# Altium integrated library WCAP-ATLI_rev15a.intlib: 161 symbols (part 1 of 2) (continued)
## WCAP-ATLI 16x31.5x7.5x0.8 860080480026 (continued)
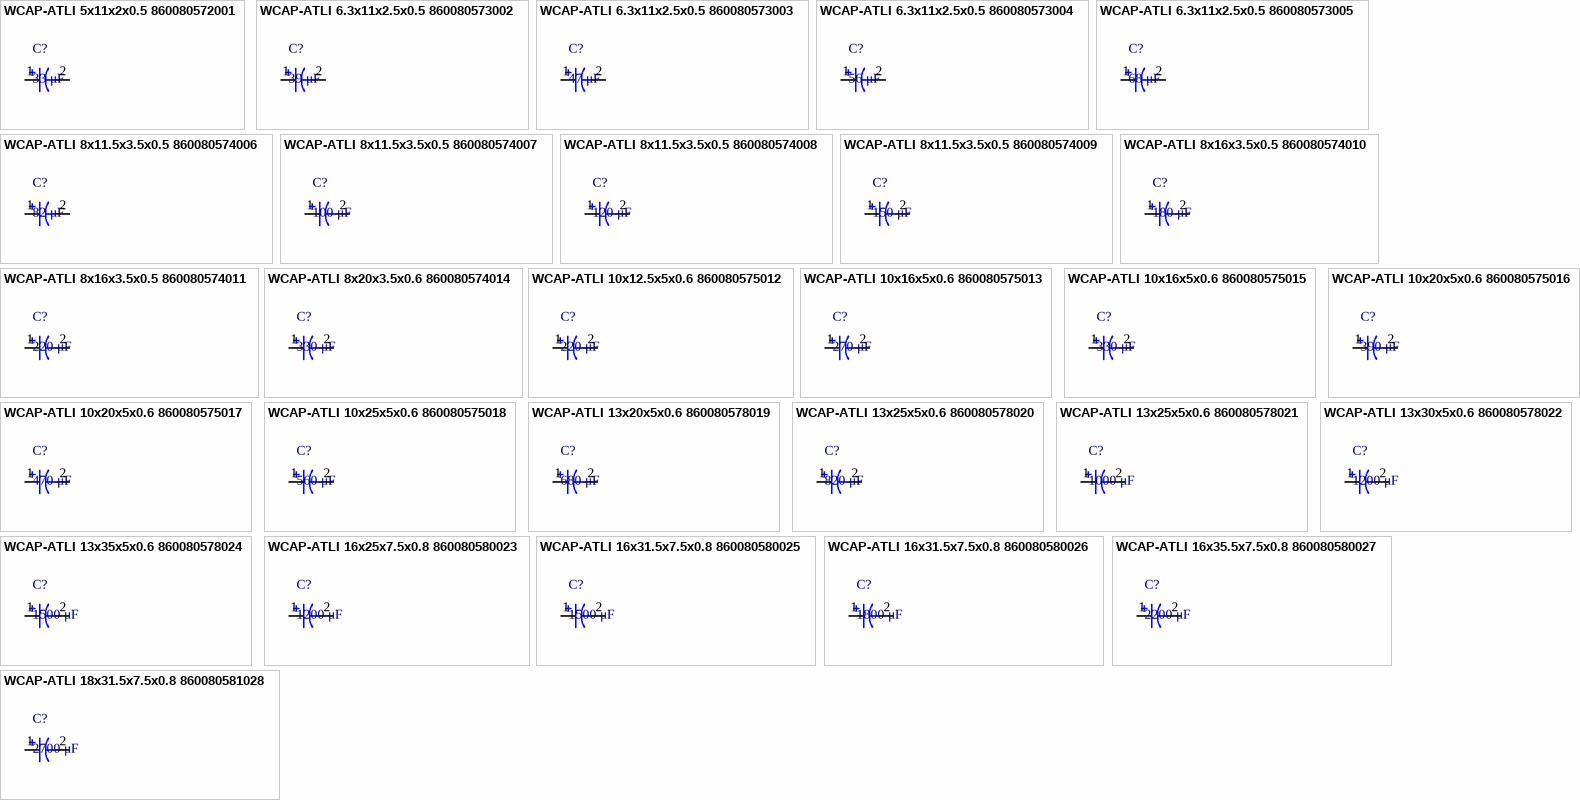
[diagram p2: symbols WCAP-ATLI 5x11x2x0.5 860080572001 to WCAP-ATLI 18x31.5x7.5x0.8 860080581028]

## WCAP-ATLI 5x11x2x0.5 860080572001
designator C?, comment 33 μF
WCAP-ATLI Aluminum Electrolytic Capacitors , 33 μF; + / - 20%; 35 V , 5 x 11; Manufacturer: Wurth Elektronik; partNo: 860080572001; E-mail: libraries@we-online.com; Characteristics: Aluminum Electrolytic Capacitor;Recommended soldering: Wave;Operating temperature: –55 °C to +105 °C;Low impedance product series;Load life: 2000–5000 h @ +105 °C; ComponentLink1Description: Manufacturer; ComponentLink1URL: http://www.we-online.com; ComponentLink2Description: Datasheet; ComponentLink2URL: http://katalog.we-online.de/pbs/datasheet/860080572001.pdf; Created by: Karrer Zheng; Created Date: 5/13/2015; Capacitance: 33 μF; Application: Applied to high frequency secondary side output filter loop, general switching power supply, DC-DC converter, AC-DC converter, adapter, charger, TV, VCR, DC motor circuit filter, LCD TV digital audio, digital TV, digital camera, digital video camera, satellite receiver and etc.
footprint WCAP-ATLI 5x11x2x0.5
pins: 1, 2

## WCAP-ATLI 6.3x11x2.5x0.5 860080573002
designator C?, comment 39 μF
WCAP-ATLI Aluminum Electrolytic Capacitors , 39 μF; + / - 20%; 35 V , 6,3 x 11; Manufacturer: Wurth Elektronik; partNo: 860080573002; E-mail: libraries@we-online.com; Characteristics: Aluminum Electrolytic Capacitor;Recommended soldering: Wave;Operating temperature: –55 °C to +105 °C;Low impedance product series;Load life: 2000–5000 h @ +105 °C; ComponentLink1Description: Manufacturer; ComponentLink1URL: http://www.we-online.com; ComponentLink2Description: Datasheet; ComponentLink2URL: http://katalog.we-online.de/pbs/datasheet/860080573002.pdf; Created by: Karrer Zheng; Created Date: 5/13/2015; Capacitance: 39 μF; Application: Applied to high frequency secondary side output filter loop, general switching power supply, DC-DC converter, AC-DC converter, adapter, charger, TV, VCR, DC motor circuit filter, LCD TV digital audio, digital TV, digital camera, digital video camera, satellite receiver and etc.
footprint WCAP-ATLI 6.3x11x2.5x0.5
pins: 1, 2

## WCAP-ATLI 6.3x11x2.5x0.5 860080573003
designator C?, comment 47 μF
WCAP-ATLI Aluminum Electrolytic Capacitors , 47 μF; + / - 20%; 35 V , 6,3 x 11; Manufacturer: Wurth Elektronik; partNo: 860080573003; E-mail: libraries@we-online.com; Characteristics: Aluminum Electrolytic Capacitor;Recommended soldering: Wave;Operating temperature: –55 °C to +105 °C;Low impedance product series;Load life: 2000–5000 h @ +105 °C; ComponentLink1Description: Manufacturer; ComponentLink1URL: http://www.we-online.com; ComponentLink2Description: Datasheet; ComponentLink2URL: http://katalog.we-online.de/pbs/datasheet/860080573003.pdf; Created by: Karrer Zheng; Created Date: 5/13/2015; Capacitance: 47 μF; Application: Applied to high frequency secondary side output filter loop, general switching power supply, DC-DC converter, AC-DC converter, adapter, charger, TV, VCR, DC motor circuit filter, LCD TV digital audio, digital TV, digital camera, digital video camera, satellite receiver and etc.
footprint WCAP-ATLI 6.3x11x2.5x0.5
pins: 1, 2

## WCAP-ATLI 6.3x11x2.5x0.5 860080573004
designator C?, comment 56 μF
WCAP-ATLI Aluminum Electrolytic Capacitors , 56 μF; + / - 20%; 35 V , 6,3 x 11; Manufacturer: Wurth Elektronik; partNo: 860080573004; E-mail: libraries@we-online.com; Characteristics: Aluminum Electrolytic Capacitor;Recommended soldering: Wave;Operating temperature: –55 °C to +105 °C;Low impedance product series;Load life: 2000–5000 h @ +105 °C; ComponentLink1Description: Manufacturer; ComponentLink1URL: http://www.we-online.com; ComponentLink2Description: Datasheet; ComponentLink2URL: http://katalog.we-online.de/pbs/datasheet/860080573004.pdf; Created by: Karrer Zheng; Created Date: 5/13/2015; Capacitance: 56 μF; Application: Applied to high frequency secondary side output filter loop, general switching power supply, DC-DC converter, AC-DC converter, adapter, charger, TV, VCR, DC motor circuit filter, LCD TV digital audio, digital TV, digital camera, digital video camera, satellite receiver and etc.
footprint WCAP-ATLI 6.3x11x2.5x0.5
pins: 1, 2

## WCAP-ATLI 6.3x11x2.5x0.5 860080573005
designator C?, comment 68 μF
WCAP-ATLI Aluminum Electrolytic Capacitors , 68 μF; + / - 20%; 35 V , 6,3 x 11; Manufacturer: Wurth Elektronik; partNo: 860080573005; E-mail: libraries@we-online.com; Characteristics: Aluminum Electrolytic Capacitor;Recommended soldering: Wave;Operating temperature: –55 °C to +105 °C;Low impedance product series;Load life: 2000–5000 h @ +105 °C; ComponentLink1Description: Manufacturer; ComponentLink1URL: http://www.we-online.com; ComponentLink2Description: Datasheet; ComponentLink2URL: http://katalog.we-online.de/pbs/datasheet/860080573005.pdf; Created by: Karrer Zheng; Created Date: 5/13/2015; Capacitance: 68 μF; Application: Applied to high frequency secondary side output filter loop, general switching power supply, DC-DC converter, AC-DC converter, adapter, charger, TV, VCR, DC motor circuit filter, LCD TV digital audio, digital TV, digital camera, digital video camera, satellite receiver and etc.
footprint WCAP-ATLI 6.3x11x2.5x0.5
pins: 1, 2

## WCAP-ATLI 8x11.5x3.5x0.5 860080574006
designator C?, comment 82 μF
WCAP-ATLI Aluminum Electrolytic Capacitors , 82 μF; + / - 20%; 35 V , 8 x 11,5; Manufacturer: Wurth Elektronik; partNo: 860080574006; E-mail: libraries@we-online.com; Characteristics: Aluminum Electrolytic Capacitor;Recommended soldering: Wave;Operating temperature: –55 °C to +105 °C;Low impedance product series;Load life: 2000–5000 h @ +105 °C; ComponentLink1Description: Manufacturer; ComponentLink1URL: http://www.we-online.com; ComponentLink2Description: Datasheet; ComponentLink2URL: http://katalog.we-online.de/pbs/datasheet/860080574006.pdf; Created by: Karrer Zheng; Created Date: 5/13/2015; Capacitance: 82 μF; Application: Applied to high frequency secondary side output filter loop, general switching power supply, DC-DC converter, AC-DC converter, adapter, charger, TV, VCR, DC motor circuit filter, LCD TV digital audio, digital TV, digital camera, digital video camera, satellite receiver and etc.
footprint WCAP-ATLI 8x11.5x3.5x0.5
pins: 1, 2

## WCAP-ATLI 8x11.5x3.5x0.5 860080574007
designator C?, comment 100 μF
WCAP-ATLI Aluminum Electrolytic Capacitors , 100 μF; + / - 20%; 35 V , 8 x 11,5; Manufacturer: Wurth Elektronik; partNo: 860080574007; E-mail: libraries@we-online.com; Characteristics: Aluminum Electrolytic Capacitor;Recommended soldering: Wave;Operating temperature: –55 °C to +105 °C;Low impedance product series;Load life: 2000–5000 h @ +105 °C; ComponentLink1Description: Manufacturer; ComponentLink1URL: http://www.we-online.com; ComponentLink2Description: Datasheet; ComponentLink2URL: http://katalog.we-online.de/pbs/datasheet/860080574007.pdf; Created by: Karrer Zheng; Created Date: 5/13/2015; Capacitance: 100 μF; Application: Applied to high frequency secondary side output filter loop, general switching power supply, DC-DC converter, AC-DC converter, adapter, charger, TV, VCR, DC motor circuit filter, LCD TV digital audio, digital TV, digital camera, digital video camera, satellite receiver and etc.
footprint WCAP-ATLI 8x11.5x3.5x0.5
pins: 1, 2

## WCAP-ATLI 8x11.5x3.5x0.5 860080574008
designator C?, comment 120 μF
WCAP-ATLI Aluminum Electrolytic Capacitors , 120 μF; + / - 20%; 35 V , 8 x 11,5; Manufacturer: Wurth Elektronik; partNo: 860080574008; E-mail: libraries@we-online.com; Characteristics: Aluminum Electrolytic Capacitor;Recommended soldering: Wave;Operating temperature: –55 °C to +105 °C;Low impedance product series;Load life: 2000–5000 h @ +105 °C; ComponentLink1Description: Manufacturer; ComponentLink1URL: http://www.we-online.com; ComponentLink2Description: Datasheet; ComponentLink2URL: http://katalog.we-online.de/pbs/datasheet/860080574008.pdf; Created by: Karrer Zheng; Created Date: 5/13/2015; Capacitance: 120 μF; Application: Applied to high frequency secondary side output filter loop, general switching power supply, DC-DC converter, AC-DC converter, adapter, charger, TV, VCR, DC motor circuit filter, LCD TV digital audio, digital TV, digital camera, digital video camera, satellite receiver and etc.
footprint WCAP-ATLI 8x11.5x3.5x0.5
pins: 1, 2

## WCAP-ATLI 8x11.5x3.5x0.5 860080574009
designator C?, comment 150 μF
WCAP-ATLI Aluminum Electrolytic Capacitors , 150 μF; + / - 20%; 35 V , 8 x 11,5; Manufacturer: Wurth Elektronik; partNo: 860080574009; E-mail: libraries@we-online.com; Characteristics: Aluminum Electrolytic Capacitor;Recommended soldering: Wave;Operating temperature: –55 °C to +105 °C;Low impedance product series;Load life: 2000–5000 h @ +105 °C; ComponentLink1Description: Manufacturer; ComponentLink1URL: http://www.we-online.com; ComponentLink2Description: Datasheet; ComponentLink2URL: http://katalog.we-online.de/pbs/datasheet/860080574009.pdf; Created by: Karrer Zheng; Created Date: 5/13/2015; Capacitance: 150 μF; Application: Applied to high frequency secondary side output filter loop, general switching power supply, DC-DC converter, AC-DC converter, adapter, charger, TV, VCR, DC motor circuit filter, LCD TV digital audio, digital TV, digital camera, digital video camera, satellite receiver and etc.
footprint WCAP-ATLI 8x11.5x3.5x0.5
pins: 1, 2

## WCAP-ATLI 8x16x3.5x0.5 860080574010
designator C?, comment 180 μF
WCAP-ATLI Aluminum Electrolytic Capacitors , 180 μF; + / - 20%; 35 V , 8 x 16; Manufacturer: Wurth Elektronik; partNo: 860080574010; E-mail: libraries@we-online.com; Characteristics: Aluminum Electrolytic Capacitor;Recommended soldering: Wave;Operating temperature: –55 °C to +105 °C;Low impedance product series;Load life: 2000–5000 h @ +105 °C; ComponentLink1Description: Manufacturer; ComponentLink1URL: http://www.we-online.com; ComponentLink2Description: Datasheet; ComponentLink2URL: http://katalog.we-online.de/pbs/datasheet/860080574010.pdf; Created by: Karrer Zheng; Created Date: 5/13/2015; Capacitance: 180 μF; Application: Applied to high frequency secondary side output filter loop, general switching power supply, DC-DC converter, AC-DC converter, adapter, charger, TV, VCR, DC motor circuit filter, LCD TV digital audio, digital TV, digital camera, digital video camera, satellite receiver and etc.
footprint WCAP-ATLI 8x16x3.5x0.5
pins: 1, 2

## WCAP-ATLI 8x16x3.5x0.5 860080574011
designator C?, comment 220 μF
WCAP-ATLI Aluminum Electrolytic Capacitors , 220 μF; + / - 20%; 35 V , 8 x 16; Manufacturer: Wurth Elektronik; partNo: 860080574011; E-mail: libraries@we-online.com; Characteristics: Aluminum Electrolytic Capacitor;Recommended soldering: Wave;Operating temperature: –55 °C to +105 °C;Low impedance product series;Load life: 2000–5000 h @ +105 °C; ComponentLink1Description: Manufacturer; ComponentLink1URL: http://www.we-online.com; ComponentLink2Description: Datasheet; ComponentLink2URL: http://katalog.we-online.de/pbs/datasheet/860080574011.pdf; Created by: Karrer Zheng; Created Date: 5/13/2015; Capacitance: 220 μF; Application: Applied to high frequency secondary side output filter loop, general switching power supply, DC-DC converter, AC-DC converter, adapter, charger, TV, VCR, DC motor circuit filter, LCD TV digital audio, digital TV, digital camera, digital video camera, satellite receiver and etc.
footprint WCAP-ATLI 8x16x3.5x0.5
pins: 1, 2

## WCAP-ATLI 8x20x3.5x0.6 860080574014
designator C?, comment 330 μF
WCAP-ATLI Aluminum Electrolytic Capacitors , 330 μF; + / - 20%; 35 V , 8 x 20; Manufacturer: Wurth Elektronik; partNo: 860080574014; E-mail: libraries@we-online.com; Characteristics: Aluminum Electrolytic Capacitor;Recommended soldering: Wave;Operating temperature: –55 °C to +105 °C;Low impedance product series;Load life: 2000–5000 h @ +105 °C; ComponentLink1Description: Manufacturer; ComponentLink1URL: http://www.we-online.com; ComponentLink2Description: Datasheet; ComponentLink2URL: http://katalog.we-online.de/pbs/datasheet/860080574014.pdf; Created by: Karrer Zheng; Created Date: 5/13/2015; Capacitance: 330 μF; Application: Applied to high frequency secondary side output filter loop, general switching power supply, DC-DC converter, AC-DC converter, adapter, charger, TV, VCR, DC motor circuit filter, LCD TV digital audio, digital TV, digital camera, digital video camera, satellite receiver and etc.
footprint WCAP-ATLI 8x20x3.5x0.6
pins: 1, 2

## WCAP-ATLI 10x12.5x5x0.6 860080575012
designator C?, comment 220 μF
WCAP-ATLI Aluminum Electrolytic Capacitors , 220 μF; + / - 20%; 35 V , 10 x 12,5; Manufacturer: Wurth Elektronik; partNo: 860080575012; E-mail: libraries@we-online.com; Characteristics: Aluminum Electrolytic Capacitor;Recommended soldering: Wave;Operating temperature: –55 °C to +105 °C;Low impedance product series;Load life: 2000–5000 h @ +105 °C; ComponentLink1Description: Manufacturer; ComponentLink1URL: http://www.we-online.com; ComponentLink2Description: Datasheet; ComponentLink2URL: http://katalog.we-online.de/pbs/datasheet/860080575012.pdf; Created by: Karrer Zheng; Created Date: 5/13/2015; Capacitance: 220 μF; Application: Applied to high frequency secondary side output filter loop, general switching power supply, DC-DC converter, AC-DC converter, adapter, charger, TV, VCR, DC motor circuit filter, LCD TV digital audio, digital TV, digital camera, digital video camera, satellite receiver and etc.
footprint WCAP-ATLI 10x12.5x5x0.6
pins: 1, 2

## WCAP-ATLI 10x16x5x0.6 860080575013
designator C?, comment 270 μF
WCAP-ATLI Aluminum Electrolytic Capacitors , 270 μF; + / - 20%; 35 V , 10 x 16; Manufacturer: Wurth Elektronik; partNo: 860080575013; E-mail: libraries@we-online.com; Characteristics: Aluminum Electrolytic Capacitor;Recommended soldering: Wave;Operating temperature: –55 °C to +105 °C;Low impedance product series;Load life: 2000–5000 h @ +105 °C; ComponentLink1Description: Manufacturer; ComponentLink1URL: http://www.we-online.com; ComponentLink2Description: Datasheet; ComponentLink2URL: http://katalog.we-online.de/pbs/datasheet/860080575013.pdf; Created by: Karrer Zheng; Created Date: 5/13/2015; Capacitance: 270 μF; Application: Applied to high frequency secondary side output filter loop, general switching power supply, DC-DC converter, AC-DC converter, adapter, charger, TV, VCR, DC motor circuit filter, LCD TV digital audio, digital TV, digital camera, digital video camera, satellite receiver and etc.
footprint WCAP-ATLI 10x16x5x0.6
pins: 1, 2

## WCAP-ATLI 10x16x5x0.6 860080575015
designator C?, comment 330 μF
WCAP-ATLI Aluminum Electrolytic Capacitors , 330 μF; + / - 20%; 35 V , 10 x 16; Manufacturer: Wurth Elektronik; partNo: 860080575015; E-mail: libraries@we-online.com; Characteristics: Aluminum Electrolytic Capacitor;Recommended soldering: Wave;Operating temperature: –55 °C to +105 °C;Low impedance product series;Load life: 2000–5000 h @ +105 °C; ComponentLink1Description: Manufacturer; ComponentLink1URL: http://www.we-online.com; ComponentLink2Description: Datasheet; ComponentLink2URL: http://katalog.we-online.de/pbs/datasheet/860080575015.pdf; Created by: Karrer Zheng; Created Date: 5/13/2015; Capacitance: 330 μF; Application: Applied to high frequency secondary side output filter loop, general switching power supply, DC-DC converter, AC-DC converter, adapter, charger, TV, VCR, DC motor circuit filter, LCD TV digital audio, digital TV, digital camera, digital video camera, satellite receiver and etc.
footprint WCAP-ATLI 10x16x5x0.6
pins: 1, 2

## WCAP-ATLI 10x20x5x0.6 860080575016
designator C?, comment 390 μF
WCAP-ATLI Aluminum Electrolytic Capacitors , 390 μF; + / - 20%; 35 V , 10 x 20; Manufacturer: Wurth Elektronik; partNo: 860080575016; E-mail: libraries@we-online.com; Characteristics: Aluminum Electrolytic Capacitor;Recommended soldering: Wave;Operating temperature: –55 °C to +105 °C;Low impedance product series;Load life: 2000–5000 h @ +105 °C; ComponentLink1Description: Manufacturer; ComponentLink1URL: http://www.we-online.com; ComponentLink2Description: Datasheet; ComponentLink2URL: http://katalog.we-online.de/pbs/datasheet/860080575016.pdf; Created by: Karrer Zheng; Created Date: 5/13/2015; Capacitance: 390 μF; Application: Applied to high frequency secondary side output filter loop, general switching power supply, DC-DC converter, AC-DC converter, adapter, charger, TV, VCR, DC motor circuit filter, LCD TV digital audio, digital TV, digital camera, digital video camera, satellite receiver and etc.
footprint WCAP-ATLI 10x20x5x0.6
pins: 1, 2

## WCAP-ATLI 10x20x5x0.6 860080575017
designator C?, comment 470 μF
WCAP-ATLI Aluminum Electrolytic Capacitors , 470 μF; + / - 20%; 35 V , 10 x 20; Manufacturer: Wurth Elektronik; partNo: 860080575017; E-mail: libraries@we-online.com; Characteristics: Aluminum Electrolytic Capacitor;Recommended soldering: Wave;Operating temperature: –55 °C to +105 °C;Low impedance product series;Load life: 2000–5000 h @ +105 °C; ComponentLink1Description: Manufacturer; ComponentLink1URL: http://www.we-online.com; ComponentLink2Description: Datasheet; ComponentLink2URL: http://katalog.we-online.de/pbs/datasheet/860080575017.pdf; Created by: Karrer Zheng; Created Date: 5/13/2015; Capacitance: 470 μF; Application: Applied to high frequency secondary side output filter loop, general switching power supply, DC-DC converter, AC-DC converter, adapter, charger, TV, VCR, DC motor circuit filter, LCD TV digital audio, digital TV, digital camera, digital video camera, satellite receiver and etc.
footprint WCAP-ATLI 10x20x5x0.6
pins: 1, 2

## WCAP-ATLI 10x25x5x0.6 860080575018
designator C?, comment 560 μF
WCAP-ATLI Aluminum Electrolytic Capacitors , 560 μF; + / - 20%; 35 V , 10 x 25; Manufacturer: Wurth Elektronik; partNo: 860080575018; E-mail: libraries@we-online.com; Characteristics: Aluminum Electrolytic Capacitor;Recommended soldering: Wave;Operating temperature: –55 °C to +105 °C;Low impedance product series;Load life: 2000–5000 h @ +105 °C; ComponentLink1Description: Manufacturer; ComponentLink1URL: http://www.we-online.com; ComponentLink2Description: Datasheet; ComponentLink2URL: http://katalog.we-online.de/pbs/datasheet/860080575018.pdf; Created by: Karrer Zheng; Created Date: 5/13/2015; Capacitance: 560 μF; Application: Applied to high frequency secondary side output filter loop, general switching power supply, DC-DC converter, AC-DC converter, adapter, charger, TV, VCR, DC motor circuit filter, LCD TV digital audio, digital TV, digital camera, digital video camera, satellite receiver and etc.
footprint WCAP-ATLI 10x25x5x0.6
pins: 1, 2

## WCAP-ATLI 13x20x5x0.6 860080578019
designator C?, comment 680 μF
WCAP-ATLI Aluminum Electrolytic Capacitors , 680 μF; + / - 20%; 35 V , 13 x 20; Manufacturer: Wurth Elektronik; partNo: 860080578019; E-mail: libraries@we-online.com; Characteristics: Aluminum Electrolytic Capacitor;Recommended soldering: Wave;Operating temperature: –55 °C to +105 °C;Low impedance product series;Load life: 2000–5000 h @ +105 °C; ComponentLink1Description: Manufacturer; ComponentLink1URL: http://www.we-online.com; ComponentLink2Description: Datasheet; ComponentLink2URL: http://katalog.we-online.de/pbs/datasheet/860080578019.pdf; Created by: Karrer Zheng; Created Date: 5/13/2015; Capacitance: 680 μF; Application: Applied to high frequency secondary side output filter loop, general switching power supply, DC-DC converter, AC-DC converter, adapter, charger, TV, VCR, DC motor circuit filter, LCD TV digital audio, digital TV, digital camera, digital video camera, satellite receiver and etc.
footprint WCAP-ATLI 13x20x5x0.6
pins: 1, 2

## WCAP-ATLI 13x25x5x0.6 860080578020
designator C?, comment 820 μF
WCAP-ATLI Aluminum Electrolytic Capacitors , 820 μF; + / - 20%; 35 V , 13 x 25; Manufacturer: Wurth Elektronik; partNo: 860080578020; E-mail: libraries@we-online.com; Characteristics: Aluminum Electrolytic Capacitor;Recommended soldering: Wave;Operating temperature: –55 °C to +105 °C;Low impedance product series;Load life: 2000–5000 h @ +105 °C; ComponentLink1Description: Manufacturer; ComponentLink1URL: http://www.we-online.com; ComponentLink2Description: Datasheet; ComponentLink2URL: http://katalog.we-online.de/pbs/datasheet/860080578020.pdf; Created by: Karrer Zheng; Created Date: 5/13/2015; Capacitance: 820 μF; Application: Applied to high frequency secondary side output filter loop, general switching power supply, DC-DC converter, AC-DC converter, adapter, charger, TV, VCR, DC motor circuit filter, LCD TV digital audio, digital TV, digital camera, digital video camera, satellite receiver and etc.
footprint WCAP-ATLI 13x25x5x0.6
pins: 1, 2

## WCAP-ATLI 13x25x5x0.6 860080578021
designator C?, comment 1000 μF
WCAP-ATLI Aluminum Electrolytic Capacitors , 1000 μF; + / - 20%; 35 V , 13 x 25; Manufacturer: Wurth Elektronik; partNo: 860080578021; E-mail: libraries@we-online.com; Characteristics: Aluminum Electrolytic Capacitor;Recommended soldering: Wave;Operating temperature: –55 °C to +105 °C;Low impedance product series;Load life: 2000–5000 h @ +105 °C; ComponentLink1Description: Manufacturer; ComponentLink1URL: http://www.we-online.com; ComponentLink2Description: Datasheet; ComponentLink2URL: http://katalog.we-online.de/pbs/datasheet/860080578021.pdf; Created by: Karrer Zheng; Created Date: 5/13/2015; Capacitance: 1000 μF; Application: Applied to high frequency secondary side output filter loop, general switching power supply, DC-DC converter, AC-DC converter, adapter, charger, TV, VCR, DC motor circuit filter, LCD TV digital audio, digital TV, digital camera, digital video camera, satellite receiver and etc.
footprint WCAP-ATLI 13x25x5x0.6
pins: 1, 2

## WCAP-ATLI 13x30x5x0.6 860080578022
designator C?, comment 1200 μF
WCAP-ATLI Aluminum Electrolytic Capacitors , 1200 μF; + / - 20%; 35 V , 13 x 30; Manufacturer: Wurth Elektronik; partNo: 860080578022; E-mail: libraries@we-online.com; Characteristics: Aluminum Electrolytic Capacitor;Recommended soldering: Wave;Operating temperature: –55 °C to +105 °C;Low impedance product series;Load life: 2000–5000 h @ +105 °C; ComponentLink1Description: Manufacturer; ComponentLink1URL: http://www.we-online.com; ComponentLink2Description: Datasheet; ComponentLink2URL: http://katalog.we-online.de/pbs/datasheet/860080578022.pdf; Created by: Karrer Zheng; Created Date: 5/13/2015; Capacitance: 1200 μF; Application: Applied to high frequency secondary side output filter loop, general switching power supply, DC-DC converter, AC-DC converter, adapter, charger, TV, VCR, DC motor circuit filter, LCD TV digital audio, digital TV, digital camera, digital video camera, satellite receiver and etc.
footprint WCAP-ATLI 13x30x5x0.6
pins: 1, 2

## WCAP-ATLI 13x35x5x0.6 860080578024
designator C?, comment 1500 μF
WCAP-ATLI Aluminum Electrolytic Capacitors , 1500 μF; + / - 20%; 35 V , 13 x 35; Manufacturer: Wurth Elektronik; partNo: 860080578024; E-mail: libraries@we-online.com; Characteristics: Aluminum Electrolytic Capacitor;Recommended soldering: Wave;Operating temperature: –55 °C to +105 °C;Low impedance product series;Load life: 2000–5000 h @ +105 °C; ComponentLink1Description: Manufacturer; ComponentLink1URL: http://www.we-online.com; ComponentLink2Description: Datasheet; ComponentLink2URL: http://katalog.we-online.de/pbs/datasheet/860080578024.pdf; Created by: Karrer Zheng; Created Date: 5/13/2015; Capacitance: 1500 μF; Application: Applied to high frequency secondary side output filter loop, general switching power supply, DC-DC converter, AC-DC converter, adapter, charger, TV, VCR, DC motor circuit filter, LCD TV digital audio, digital TV, digital camera, digital video camera, satellite receiver and etc.
footprint WCAP-ATLI 13x35x5x0.6
pins: 1, 2

## WCAP-ATLI 16x25x7.5x0.8 860080580023
designator C?, comment 1200 μF
WCAP-ATLI Aluminum Electrolytic Capacitors , 1200 μF; + / - 20%; 35 V , 16 x 25; Manufacturer: Wurth Elektronik; partNo: 860080580023; E-mail: libraries@we-online.com; Characteristics: Aluminum Electrolytic Capacitor;Recommended soldering: Wave;Operating temperature: –55 °C to +105 °C;Low impedance product series;Load life: 2000–5000 h @ +105 °C; ComponentLink1Description: Manufacturer; ComponentLink1URL: http://www.we-online.com; ComponentLink2Description: Datasheet; ComponentLink2URL: http://katalog.we-online.de/pbs/datasheet/860080580023.pdf; Created by: Karrer Zheng; Created Date: 5/13/2015; Capacitance: 1200 μF; Application: Applied to high frequency secondary side output filter loop, general switching power supply, DC-DC converter, AC-DC converter, adapter, charger, TV, VCR, DC motor circuit filter, LCD TV digital audio, digital TV, digital camera, digital video camera, satellite receiver and etc.
footprint WCAP-ATLI 16x25x7.5x0.8
pins: 1, 2

## WCAP-ATLI 16x31.5x7.5x0.8 860080580025
designator C?, comment 1500 μF
WCAP-ATLI Aluminum Electrolytic Capacitors , 1500 μF; + / - 20%; 35 V , 16 x 31,5; Manufacturer: Wurth Elektronik; partNo: 860080580025; E-mail: libraries@we-online.com; Characteristics: Aluminum Electrolytic Capacitor;Recommended soldering: Wave;Operating temperature: –55 °C to +105 °C;Low impedance product series;Load life: 2000–5000 h @ +105 °C; ComponentLink1Description: Manufacturer; ComponentLink1URL: http://www.we-online.com; ComponentLink2Description: Datasheet; ComponentLink2URL: http://katalog.we-online.de/pbs/datasheet/860080580025.pdf; Created by: Karrer Zheng; Created Date: 5/13/2015; Capacitance: 1500 μF; Application: Applied to high frequency secondary side output filter loop, general switching power supply, DC-DC converter, AC-DC converter, adapter, charger, TV, VCR, DC motor circuit filter, LCD TV digital audio, digital TV, digital camera, digital video camera, satellite receiver and etc.
footprint WCAP-ATLI 16x31.5x7.5x0.8
pins: 1, 2

## WCAP-ATLI 16x31.5x7.5x0.8 860080580026
designator C?, comment 1800 μF
WCAP-ATLI Aluminum Electrolytic Capacitors , 1800 μF; + / - 20%; 35 V , 16 x 31,5; Manufacturer: Wurth Elektronik; partNo: 860080580026; E-mail: libraries@we-online.com; Characteristics: Aluminum Electrolytic Capacitor;Recommended soldering: Wave;Operating temperature: –55 °C to +105 °C;Low impedance product series;Load life: 2000–5000 h @ +105 °C; ComponentLink1Description: Manufacturer; ComponentLink1URL: http://www.we-online.com; ComponentLink2Description: Datasheet; ComponentLink2URL: http://katalog.we-online.de/pbs/datasheet/860080580026.pdf; Created by: Karrer Zheng; Created Date: 5/13/2015; Capacitance: 1800 μF; Application: Applied to high frequency secondary side output filter loop, general switching power supply, DC-DC converter, AC-DC converter, adapter, charger, TV, VCR, DC motor circuit filter, LCD TV digital audio, digital TV, digital camera, digital video camera, satellite receiver and etc.
footprint WCAP-ATLI 16x31.5x7.5x0.8
pins: 1, 2

## WCAP-ATLI 16x35.5x7.5x0.8 860080580027
designator C?, comment 2200 μF
WCAP-ATLI Aluminum Electrolytic Capacitors , 2200 μF; + / - 20%; 35 V , 16 x 35,5; Manufacturer: Wurth Elektronik; partNo: 860080580027; E-mail: libraries@we-online.com; Characteristics: Aluminum Electrolytic Capacitor;Recommended soldering: Wave;Operating temperature: –55 °C to +105 °C;Low impedance product series;Load life: 2000–5000 h @ +105 °C; ComponentLink1Description: Manufacturer; ComponentLink1URL: http://www.we-online.com; ComponentLink2Description: Datasheet; ComponentLink2URL: http://katalog.we-online.de/pbs/datasheet/860080580027.pdf; Created by: Karrer Zheng; Created Date: 5/13/2015; Capacitance: 2200 μF; Application: Applied to high frequency secondary side output filter loop, general switching power supply, DC-DC converter, AC-DC converter, adapter, charger, TV, VCR, DC motor circuit filter, LCD TV digital audio, digital TV, digital camera, digital video camera, satellite receiver and etc.
footprint WCAP-ATLI 16x35.5x7.5x0.8
pins: 1, 2

## WCAP-ATLI 18x31.5x7.5x0.8 860080581028
designator C?, comment 2700 μF
WCAP-ATLI Aluminum Electrolytic Capacitors , 2700 μF; + / - 20%; 35 V , 18 x 31,5; Manufacturer: Wurth Elektronik; partNo: 860080581028; E-mail: libraries@we-online.com; Characteristics: Aluminum Electrolytic Capacitor;Recommended soldering: Wave;Operating temperature: –55 °C to +105 °C;Low impedance product series;Load life: 2000–5000 h @ +105 °C; ComponentLink1Description: Manufacturer; ComponentLink1URL: http://www.we-online.com; ComponentLink2Description: Datasheet; ComponentLink2URL: http://katalog.we-online.de/pbs/datasheet/860080581028.pdf; Created by: Karrer Zheng; Created Date: 5/13/2015; Capacitance: 2700 μF; Application: Applied to high frequency secondary side output filter loop, general switching power supply, DC-DC converter, AC-DC converter, adapter, charger, TV, VCR, DC motor circuit filter, LCD TV digital audio, digital TV, digital camera, digital video camera, satellite receiver and etc.
footprint WCAP-ATLI 18x31.5x7.5x0.8
pins: 1, 2


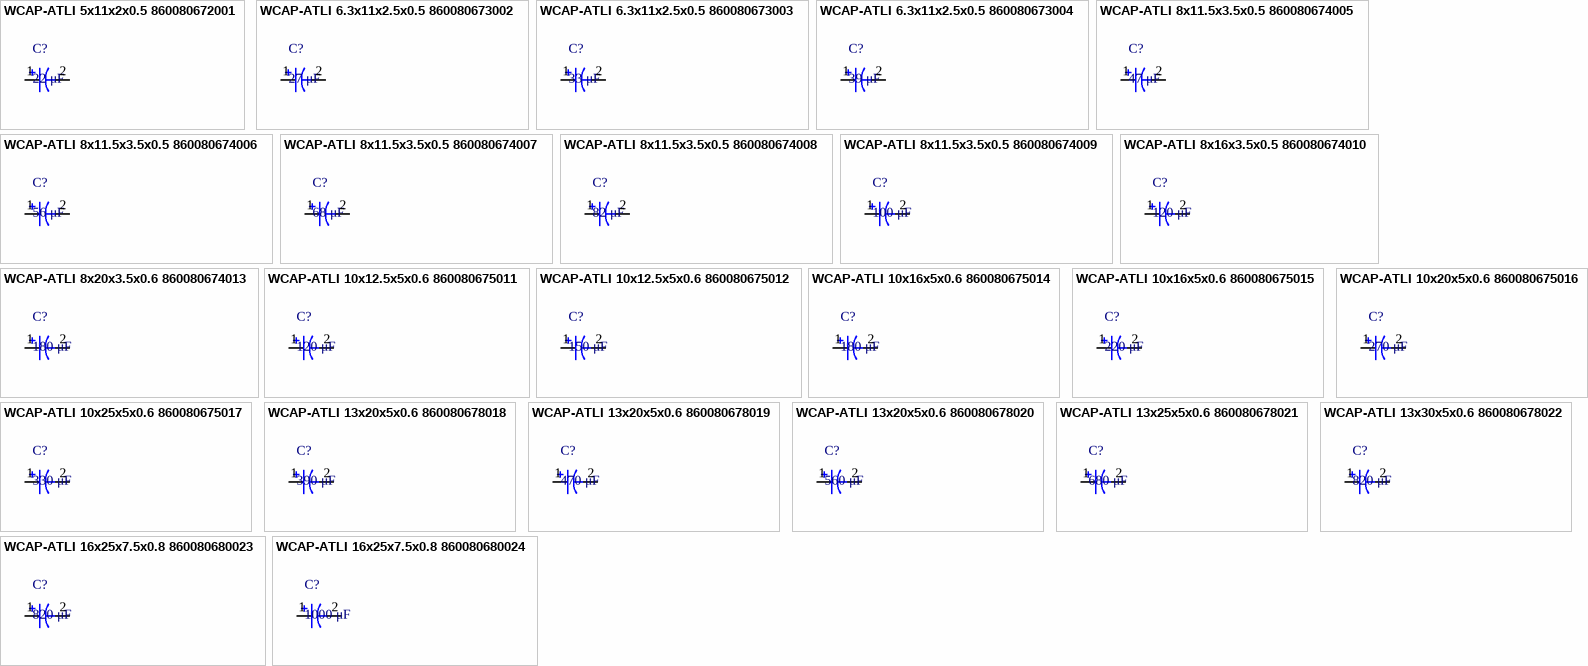
[diagram p3: symbols WCAP-ATLI 5x11x2x0.5 860080672001 to WCAP-ATLI 16x25x7.5x0.8 860080680024]

## WCAP-ATLI 5x11x2x0.5 860080672001
designator C?, comment 22 μF
WCAP-ATLI Aluminum Electrolytic Capacitors , 22 μF; + / - 20%; 50 V , 5 x 11; Manufacturer: Wurth Elektronik; partNo: 860080672001; E-mail: libraries@we-online.com; Characteristics: Aluminum Electrolytic Capacitor;Recommended soldering: Wave;Operating temperature: –55 °C to +105 °C;Low impedance product series;Load life: 2000–5000 h @ +105 °C; ComponentLink1Description: Manufacturer; ComponentLink1URL: http://www.we-online.com; ComponentLink2Description: Datasheet; ComponentLink2URL: http://katalog.we-online.de/pbs/datasheet/860080672001.pdf; Created by: Karrer Zheng; Created Date: 5/13/2015; Capacitance: 22 μF; Application: Applied to high frequency secondary side output filter loop, general switching power supply, DC-DC converter, AC-DC converter, adapter, charger, TV, VCR, DC motor circuit filter, LCD TV digital audio, digital TV, digital camera, digital video camera, satellite receiver and etc.
footprint WCAP-ATLI 5x11x2x0.5
pins: 1, 2

## WCAP-ATLI 6.3x11x2.5x0.5 860080673002
designator C?, comment 27 μF
WCAP-ATLI Aluminum Electrolytic Capacitors , 27 μF; + / - 20%; 50 V , 6,3 x 11; Manufacturer: Wurth Elektronik; partNo: 860080673002; E-mail: libraries@we-online.com; Characteristics: Aluminum Electrolytic Capacitor;Recommended soldering: Wave;Operating temperature: –55 °C to +105 °C;Low impedance product series;Load life: 2000–5000 h @ +105 °C; ComponentLink1Description: Manufacturer; ComponentLink1URL: http://www.we-online.com; ComponentLink2Description: Datasheet; ComponentLink2URL: http://katalog.we-online.de/pbs/datasheet/860080673002.pdf; Created by: Karrer Zheng; Created Date: 5/13/2015; Capacitance: 27 μF; Application: Applied to high frequency secondary side output filter loop, general switching power supply, DC-DC converter, AC-DC converter, adapter, charger, TV, VCR, DC motor circuit filter, LCD TV digital audio, digital TV, digital camera, digital video camera, satellite receiver and etc.
footprint WCAP-ATLI 6.3x11x2.5x0.5
pins: 1, 2

## WCAP-ATLI 6.3x11x2.5x0.5 860080673003
designator C?, comment 33 μF
WCAP-ATLI Aluminum Electrolytic Capacitors , 33 μF; + / - 20%; 50 V , 6,3 x 11; Manufacturer: Wurth Elektronik; partNo: 860080673003; E-mail: libraries@we-online.com; Characteristics: Aluminum Electrolytic Capacitor;Recommended soldering: Wave;Operating temperature: –55 °C to +105 °C;Low impedance product series;Load life: 2000–5000 h @ +105 °C; ComponentLink1Description: Manufacturer; ComponentLink1URL: http://www.we-online.com; ComponentLink2Description: Datasheet; ComponentLink2URL: http://katalog.we-online.de/pbs/datasheet/860080673003.pdf; Created by: Karrer Zheng; Created Date: 5/13/2015; Capacitance: 33 μF; Application: Applied to high frequency secondary side output filter loop, general switching power supply, DC-DC converter, AC-DC converter, adapter, charger, TV, VCR, DC motor circuit filter, LCD TV digital audio, digital TV, digital camera, digital video camera, satellite receiver and etc.
footprint WCAP-ATLI 6.3x11x2.5x0.5
pins: 1, 2

## WCAP-ATLI 6.3x11x2.5x0.5 860080673004
designator C?, comment 39 μF
WCAP-ATLI Aluminum Electrolytic Capacitors , 39 μF; + / - 20%; 50 V , 6,3 x 11; Manufacturer: Wurth Elektronik; partNo: 860080673004; E-mail: libraries@we-online.com; Characteristics: Aluminum Electrolytic Capacitor;Recommended soldering: Wave;Operating temperature: –55 °C to +105 °C;Low impedance product series;Load life: 2000–5000 h @ +105 °C; ComponentLink1Description: Manufacturer; ComponentLink1URL: http://www.we-online.com; ComponentLink2Description: Datasheet; ComponentLink2URL: http://katalog.we-online.de/pbs/datasheet/860080673004.pdf; Created by: Karrer Zheng; Created Date: 5/13/2015; Capacitance: 39 μF; Application: Applied to high frequency secondary side output filter loop, general switching power supply, DC-DC converter, AC-DC converter, adapter, charger, TV, VCR, DC motor circuit filter, LCD TV digital audio, digital TV, digital camera, digital video camera, satellite receiver and etc.
footprint WCAP-ATLI 6.3x11x2.5x0.5
pins: 1, 2

## WCAP-ATLI 8x11.5x3.5x0.5 860080674005
designator C?, comment 47 μF
WCAP-ATLI Aluminum Electrolytic Capacitors , 47 μF; + / - 20%; 50 V , 8 x 11,5; Manufacturer: Wurth Elektronik; partNo: 860080674005; E-mail: libraries@we-online.com; Characteristics: Aluminum Electrolytic Capacitor;Recommended soldering: Wave;Operating temperature: –55 °C to +105 °C;Low impedance product series;Load life: 2000–5000 h @ +105 °C; ComponentLink1Description: Manufacturer; ComponentLink1URL: http://www.we-online.com; ComponentLink2Description: Datasheet; ComponentLink2URL: http://katalog.we-online.de/pbs/datasheet/860080674005.pdf; Created by: Karrer Zheng; Created Date: 5/13/2015; Capacitance: 47 μF; Application: Applied to high frequency secondary side output filter loop, general switching power supply, DC-DC converter, AC-DC converter, adapter, charger, TV, VCR, DC motor circuit filter, LCD TV digital audio, digital TV, digital camera, digital video camera, satellite receiver and etc.
footprint WCAP-ATLI 8x11.5x3.5x0.5
pins: 1, 2

## WCAP-ATLI 8x11.5x3.5x0.5 860080674006
designator C?, comment 56 μF
WCAP-ATLI Aluminum Electrolytic Capacitors , 56 μF; + / - 20%; 50 V , 8 x 11,5; Manufacturer: Wurth Elektronik; partNo: 860080674006; E-mail: libraries@we-online.com; Characteristics: Aluminum Electrolytic Capacitor;Recommended soldering: Wave;Operating temperature: –55 °C to +105 °C;Low impedance product series;Load life: 2000–5000 h @ +105 °C; ComponentLink1Description: Manufacturer; ComponentLink1URL: http://www.we-online.com; ComponentLink2Description: Datasheet; ComponentLink2URL: http://katalog.we-online.de/pbs/datasheet/860080674006.pdf; Created by: Karrer Zheng; Created Date: 5/13/2015; Capacitance: 56 μF; Application: Applied to high frequency secondary side output filter loop, general switching power supply, DC-DC converter, AC-DC converter, adapter, charger, TV, VCR, DC motor circuit filter, LCD TV digital audio, digital TV, digital camera, digital video camera, satellite receiver and etc.
footprint WCAP-ATLI 8x11.5x3.5x0.5
pins: 1, 2

## WCAP-ATLI 8x11.5x3.5x0.5 860080674007
designator C?, comment 68 μF
WCAP-ATLI Aluminum Electrolytic Capacitors , 68 μF; + / - 20%; 50 V , 8 x 11,5; Manufacturer: Wurth Elektronik; partNo: 860080674007; E-mail: libraries@we-online.com; Characteristics: Aluminum Electrolytic Capacitor;Recommended soldering: Wave;Operating temperature: –55 °C to +105 °C;Low impedance product series;Load life: 2000–5000 h @ +105 °C; ComponentLink1Description: Manufacturer; ComponentLink1URL: http://www.we-online.com; ComponentLink2Description: Datasheet; ComponentLink2URL: http://katalog.we-online.de/pbs/datasheet/860080674007.pdf; Created by: Karrer Zheng; Created Date: 5/13/2015; Capacitance: 68 μF; Application: Applied to high frequency secondary side output filter loop, general switching power supply, DC-DC converter, AC-DC converter, adapter, charger, TV, VCR, DC motor circuit filter, LCD TV digital audio, digital TV, digital camera, digital video camera, satellite receiver and etc.
footprint WCAP-ATLI 8x11.5x3.5x0.5
pins: 1, 2

## WCAP-ATLI 8x11.5x3.5x0.5 860080674008
designator C?, comment 82 μF
WCAP-ATLI Aluminum Electrolytic Capacitors , 82 μF; + / - 20%; 50 V , 8 x 11,5; Manufacturer: Wurth Elektronik; partNo: 860080674008; E-mail: libraries@we-online.com; Characteristics: Aluminum Electrolytic Capacitor;Recommended soldering: Wave;Operating temperature: –55 °C to +105 °C;Low impedance product series;Load life: 2000–5000 h @ +105 °C; ComponentLink1Description: Manufacturer; ComponentLink1URL: http://www.we-online.com; ComponentLink2Description: Datasheet; ComponentLink2URL: http://katalog.we-online.de/pbs/datasheet/860080674008.pdf; Created by: Karrer Zheng; Created Date: 5/13/2015; Capacitance: 82 μF; Application: Applied to high frequency secondary side output filter loop, general switching power supply, DC-DC converter, AC-DC converter, adapter, charger, TV, VCR, DC motor circuit filter, LCD TV digital audio, digital TV, digital camera, digital video camera, satellite receiver and etc.
footprint WCAP-ATLI 8x11.5x3.5x0.5
pins: 1, 2

## WCAP-ATLI 8x11.5x3.5x0.5 860080674009
designator C?, comment 100 μF
WCAP-ATLI Aluminum Electrolytic Capacitors , 100 μF; + / - 20%; 50 V , 8 x 11,5; Manufacturer: Wurth Elektronik; partNo: 860080674009; E-mail: libraries@we-online.com; Characteristics: Aluminum Electrolytic Capacitor;Recommended soldering: Wave;Operating temperature: –55 °C to +105 °C;Low impedance product series;Load life: 2000–5000 h @ +105 °C; ComponentLink1Description: Manufacturer; ComponentLink1URL: http://www.we-online.com; ComponentLink2Description: Datasheet; ComponentLink2URL: http://katalog.we-online.de/pbs/datasheet/860080674009.pdf; Created by: Karrer Zheng; Created Date: 5/13/2015; Capacitance: 100 μF; Application: Applied to high frequency secondary side output filter loop, general switching power supply, DC-DC converter, AC-DC converter, adapter, charger, TV, VCR, DC motor circuit filter, LCD TV digital audio, digital TV, digital camera, digital video camera, satellite receiver and etc.
footprint WCAP-ATLI 8x11.5x3.5x0.5
pins: 1, 2

## WCAP-ATLI 8x16x3.5x0.5 860080674010
designator C?, comment 120 μF
WCAP-ATLI Aluminum Electrolytic Capacitors , 120 μF; + / - 20%; 50 V , 8 x 16; Manufacturer: Wurth Elektronik; partNo: 860080674010; E-mail: libraries@we-online.com; Characteristics: Aluminum Electrolytic Capacitor;Recommended soldering: Wave;Operating temperature: –55 °C to +105 °C;Low impedance product series;Load life: 2000–5000 h @ +105 °C; ComponentLink1Description: Manufacturer; ComponentLink1URL: http://www.we-online.com; ComponentLink2Description: Datasheet; ComponentLink2URL: http://katalog.we-online.de/pbs/datasheet/860080674010.pdf; Created by: Karrer Zheng; Created Date: 5/13/2015; Capacitance: 120 μF; Application: Applied to high frequency secondary side output filter loop, general switching power supply, DC-DC converter, AC-DC converter, adapter, charger, TV, VCR, DC motor circuit filter, LCD TV digital audio, digital TV, digital camera, digital video camera, satellite receiver and etc.
footprint WCAP-ATLI 8x16x3.5x0.5
pins: 1, 2

## WCAP-ATLI 8x20x3.5x0.6 860080674013
designator C?, comment 180 μF
WCAP-ATLI Aluminum Electrolytic Capacitors , 180 μF; + / - 20%; 50 V , 8 x 20; Manufacturer: Wurth Elektronik; partNo: 860080674013; E-mail: libraries@we-online.com; Characteristics: Aluminum Electrolytic Capacitor;Recommended soldering: Wave;Operating temperature: –55 °C to +105 °C;Low impedance product series;Load life: 2000–5000 h @ +105 °C; ComponentLink1Description: Manufacturer; ComponentLink1URL: http://www.we-online.com; ComponentLink2Description: Datasheet; ComponentLink2URL: http://katalog.we-online.de/pbs/datasheet/860080674013.pdf; Created by: Karrer Zheng; Created Date: 5/13/2015; Capacitance: 180 μF; Application: Applied to high frequency secondary side output filter loop, general switching power supply, DC-DC converter, AC-DC converter, adapter, charger, TV, VCR, DC motor circuit filter, LCD TV digital audio, digital TV, digital camera, digital video camera, satellite receiver and etc.
footprint WCAP-ATLI 8x20x3.5x0.6
pins: 1, 2

## WCAP-ATLI 10x12.5x5x0.6 860080675011
designator C?, comment 120 μF
WCAP-ATLI Aluminum Electrolytic Capacitors , 120 μF; + / - 20%; 50 V , 10 x 12,5; Manufacturer: Wurth Elektronik; partNo: 860080675011; E-mail: libraries@we-online.com; Characteristics: Aluminum Electrolytic Capacitor;Recommended soldering: Wave;Operating temperature: –55 °C to +105 °C;Low impedance product series;Load life: 2000–5000 h @ +105 °C; ComponentLink1Description: Manufacturer; ComponentLink1URL: http://www.we-online.com; ComponentLink2Description: Datasheet; ComponentLink2URL: http://katalog.we-online.de/pbs/datasheet/860080675011.pdf; Created by: Karrer Zheng; Created Date: 5/13/2015; Capacitance: 120 μF; Application: Applied to high frequency secondary side output filter loop, general switching power supply, DC-DC converter, AC-DC converter, adapter, charger, TV, VCR, DC motor circuit filter, LCD TV digital audio, digital TV, digital camera, digital video camera, satellite receiver and etc.
footprint WCAP-ATLI 10x12.5x5x0.6
pins: 1, 2

## WCAP-ATLI 10x12.5x5x0.6 860080675012
designator C?, comment 150 μF
WCAP-ATLI Aluminum Electrolytic Capacitors , 150 μF; + / - 20%; 50 V , 10 x 12,5; Manufacturer: Wurth Elektronik; partNo: 860080675012; E-mail: libraries@we-online.com; Characteristics: Aluminum Electrolytic Capacitor;Recommended soldering: Wave;Operating temperature: –55 °C to +105 °C;Low impedance product series;Load life: 2000–5000 h @ +105 °C; ComponentLink1Description: Manufacturer; ComponentLink1URL: http://www.we-online.com; ComponentLink2Description: Datasheet; ComponentLink2URL: http://katalog.we-online.de/pbs/datasheet/860080675012.pdf; Created by: Karrer Zheng; Created Date: 5/13/2015; Capacitance: 150 μF; Application: Applied to high frequency secondary side output filter loop, general switching power supply, DC-DC converter, AC-DC converter, adapter, charger, TV, VCR, DC motor circuit filter, LCD TV digital audio, digital TV, digital camera, digital video camera, satellite receiver and etc.
footprint WCAP-ATLI 10x12.5x5x0.6
pins: 1, 2

## WCAP-ATLI 10x16x5x0.6 860080675014
designator C?, comment 180 μF
WCAP-ATLI Aluminum Electrolytic Capacitors , 180 μF; + / - 20%; 50 V , 10 x 16; Manufacturer: Wurth Elektronik; partNo: 860080675014; E-mail: libraries@we-online.com; Characteristics: Aluminum Electrolytic Capacitor;Recommended soldering: Wave;Operating temperature: –55 °C to +105 °C;Low impedance product series;Load life: 2000–5000 h @ +105 °C; ComponentLink1Description: Manufacturer; ComponentLink1URL: http://www.we-online.com; ComponentLink2Description: Datasheet; ComponentLink2URL: http://katalog.we-online.de/pbs/datasheet/860080675014.pdf; Created by: Karrer Zheng; Created Date: 5/13/2015; Capacitance: 180 μF; Application: Applied to high frequency secondary side output filter loop, general switching power supply, DC-DC converter, AC-DC converter, adapter, charger, TV, VCR, DC motor circuit filter, LCD TV digital audio, digital TV, digital camera, digital video camera, satellite receiver and etc.
footprint WCAP-ATLI 10x16x5x0.6
pins: 1, 2

## WCAP-ATLI 10x16x5x0.6 860080675015
designator C?, comment 220 μF
WCAP-ATLI Aluminum Electrolytic Capacitors , 220 μF; + / - 20%; 50 V , 10 x 16; Manufacturer: Wurth Elektronik; partNo: 860080675015; E-mail: libraries@we-online.com; Characteristics: Aluminum Electrolytic Capacitor;Recommended soldering: Wave;Operating temperature: –55 °C to +105 °C;Low impedance product series;Load life: 2000–5000 h @ +105 °C; ComponentLink1Description: Manufacturer; ComponentLink1URL: http://www.we-online.com; ComponentLink2Description: Datasheet; ComponentLink2URL: http://katalog.we-online.de/pbs/datasheet/860080675015.pdf; Created by: Karrer Zheng; Created Date: 5/13/2015; Capacitance: 220 μF; Application: Applied to high frequency secondary side output filter loop, general switching power supply, DC-DC converter, AC-DC converter, adapter, charger, TV, VCR, DC motor circuit filter, LCD TV digital audio, digital TV, digital camera, digital video camera, satellite receiver and etc.
footprint WCAP-ATLI 10x16x5x0.6
pins: 1, 2

## WCAP-ATLI 10x20x5x0.6 860080675016
designator C?, comment 270 μF
WCAP-ATLI Aluminum Electrolytic Capacitors , 270 μF; + / - 20%; 50 V , 10 x 20; Manufacturer: Wurth Elektronik; partNo: 860080675016; E-mail: libraries@we-online.com; Characteristics: Aluminum Electrolytic Capacitor;Recommended soldering: Wave;Operating temperature: –55 °C to +105 °C;Low impedance product series;Load life: 2000–5000 h @ +105 °C; ComponentLink1Description: Manufacturer; ComponentLink1URL: http://www.we-online.com; ComponentLink2Description: Datasheet; ComponentLink2URL: http://katalog.we-online.de/pbs/datasheet/860080675016.pdf; Created by: Karrer Zheng; Created Date: 5/13/2015; Capacitance: 270 μF; Application: Applied to high frequency secondary side output filter loop, general switching power supply, DC-DC converter, AC-DC converter, adapter, charger, TV, VCR, DC motor circuit filter, LCD TV digital audio, digital TV, digital camera, digital video camera, satellite receiver and etc.
footprint WCAP-ATLI 10x20x5x0.6
pins: 1, 2

## WCAP-ATLI 10x25x5x0.6 860080675017
designator C?, comment 330 μF
WCAP-ATLI Aluminum Electrolytic Capacitors , 330 μF; + / - 20%; 50 V , 10 x 25; Manufacturer: Wurth Elektronik; partNo: 860080675017; E-mail: libraries@we-online.com; Characteristics: Aluminum Electrolytic Capacitor;Recommended soldering: Wave;Operating temperature: –55 °C to +105 °C;Low impedance product series;Load life: 2000–5000 h @ +105 °C; ComponentLink1Description: Manufacturer; ComponentLink1URL: http://www.we-online.com; ComponentLink2Description: Datasheet; ComponentLink2URL: http://katalog.we-online.de/pbs/datasheet/860080675017.pdf; Created by: Karrer Zheng; Created Date: 5/13/2015; Capacitance: 330 μF; Application: Applied to high frequency secondary side output filter loop, general switching power supply, DC-DC converter, AC-DC converter, adapter, charger, TV, VCR, DC motor circuit filter, LCD TV digital audio, digital TV, digital camera, digital video camera, satellite receiver and etc.
footprint WCAP-ATLI 10x25x5x0.6
pins: 1, 2

## WCAP-ATLI 13x20x5x0.6 860080678018
designator C?, comment 390 μF
WCAP-ATLI Aluminum Electrolytic Capacitors , 390 μF; + / - 20%; 50 V , 13 x 20; Manufacturer: Wurth Elektronik; partNo: 860080678018; E-mail: libraries@we-online.com; Characteristics: Aluminum Electrolytic Capacitor;Recommended soldering: Wave;Operating temperature: –55 °C to +105 °C;Low impedance product series;Load life: 2000–5000 h @ +105 °C; ComponentLink1Description: Manufacturer; ComponentLink1URL: http://www.we-online.com; ComponentLink2Description: Datasheet; ComponentLink2URL: http://katalog.we-online.de/pbs/datasheet/860080678018.pdf; Created by: Karrer Zheng; Created Date: 5/13/2015; Capacitance: 390 μF; Application: Applied to high frequency secondary side output filter loop, general switching power supply, DC-DC converter, AC-DC converter, adapter, charger, TV, VCR, DC motor circuit filter, LCD TV digital audio, digital TV, digital camera, digital video camera, satellite receiver and etc.
footprint WCAP-ATLI 13x20x5x0.6
pins: 1, 2

## WCAP-ATLI 13x20x5x0.6 860080678019
designator C?, comment 470 μF
WCAP-ATLI Aluminum Electrolytic Capacitors , 470 μF; + / - 20%; 50 V , 13 x 20; Manufacturer: Wurth Elektronik; partNo: 860080678019; E-mail: libraries@we-online.com; Characteristics: Aluminum Electrolytic Capacitor;Recommended soldering: Wave;Operating temperature: –55 °C to +105 °C;Low impedance product series;Load life: 2000–5000 h @ +105 °C; ComponentLink1Description: Manufacturer; ComponentLink1URL: http://www.we-online.com; ComponentLink2Description: Datasheet; ComponentLink2URL: http://katalog.we-online.de/pbs/datasheet/860080678019.pdf; Created by: Karrer Zheng; Created Date: 5/13/2015; Capacitance: 470 μF; Application: Applied to high frequency secondary side output filter loop, general switching power supply, DC-DC converter, AC-DC converter, adapter, charger, TV, VCR, DC motor circuit filter, LCD TV digital audio, digital TV, digital camera, digital video camera, satellite receiver and etc.
footprint WCAP-ATLI 13x20x5x0.6
pins: 1, 2

## WCAP-ATLI 13x20x5x0.6 860080678020
designator C?, comment 560 μF
WCAP-ATLI Aluminum Electrolytic Capacitors , 560 μF; + / - 20%; 50 V , 13 x 20; Manufacturer: Wurth Elektronik; partNo: 860080678020; E-mail: libraries@we-online.com; Characteristics: Aluminum Electrolytic Capacitor;Recommended soldering: Wave;Operating temperature: –55 °C to +105 °C;Low impedance product series;Load life: 2000–5000 h @ +105 °C; ComponentLink1Description: Manufacturer; ComponentLink1URL: http://www.we-online.com; ComponentLink2Description: Datasheet; ComponentLink2URL: http://katalog.we-online.de/pbs/datasheet/860080678020.pdf; Created by: Karrer Zheng; Created Date: 5/13/2015; Capacitance: 560 μF; Application: Applied to high frequency secondary side output filter loop, general switching power supply, DC-DC converter, AC-DC converter, adapter, charger, TV, VCR, DC motor circuit filter, LCD TV digital audio, digital TV, digital camera, digital video camera, satellite receiver and etc.
footprint WCAP-ATLI 13x20x5x0.6
pins: 1, 2

## WCAP-ATLI 13x25x5x0.6 860080678021
designator C?, comment 680 μF
WCAP-ATLI Aluminum Electrolytic Capacitors , 680 μF; + / - 20%; 50 V , 13 x 25; Manufacturer: Wurth Elektronik; partNo: 860080678021; E-mail: libraries@we-online.com; Characteristics: Aluminum Electrolytic Capacitor;Recommended soldering: Wave;Operating temperature: –55 °C to +105 °C;Low impedance product series;Load life: 2000–5000 h @ +105 °C; ComponentLink1Description: Manufacturer; ComponentLink1URL: http://www.we-online.com; ComponentLink2Description: Datasheet; ComponentLink2URL: http://katalog.we-online.de/pbs/datasheet/860080678021.pdf; Created by: Karrer Zheng; Created Date: 5/13/2015; Capacitance: 680 μF; Application: Applied to high frequency secondary side output filter loop, general switching power supply, DC-DC converter, AC-DC converter, adapter, charger, TV, VCR, DC motor circuit filter, LCD TV digital audio, digital TV, digital camera, digital video camera, satellite receiver and etc.
footprint WCAP-ATLI 13x25x5x0.6
pins: 1, 2

## WCAP-ATLI 13x30x5x0.6 860080678022
designator C?, comment 820 μF
WCAP-ATLI Aluminum Electrolytic Capacitors , 820 μF; + / - 20%; 50 V , 13 x 30; Manufacturer: Wurth Elektronik; partNo: 860080678022; E-mail: libraries@we-online.com; Characteristics: Aluminum Electrolytic Capacitor;Recommended soldering: Wave;Operating temperature: –55 °C to +105 °C;Low impedance product series;Load life: 2000–5000 h @ +105 °C; ComponentLink1Description: Manufacturer; ComponentLink1URL: http://www.we-online.com; ComponentLink2Description: Datasheet; ComponentLink2URL: http://katalog.we-online.de/pbs/datasheet/860080678022.pdf; Created by: Karrer Zheng; Created Date: 5/13/2015; Capacitance: 820 μF; Application: Applied to high frequency secondary side output filter loop, general switching power supply, DC-DC converter, AC-DC converter, adapter, charger, TV, VCR, DC motor circuit filter, LCD TV digital audio, digital TV, digital camera, digital video camera, satellite receiver and etc.
footprint WCAP-ATLI 13x30x5x0.6
pins: 1, 2

## WCAP-ATLI 16x25x7.5x0.8 860080680023
designator C?, comment 820 μF
WCAP-ATLI Aluminum Electrolytic Capacitors , 820 μF; + / - 20%; 50 V , 16 x 25; Manufacturer: Wurth Elektronik; partNo: 860080680023; E-mail: libraries@we-online.com; Characteristics: Aluminum Electrolytic Capacitor;Recommended soldering: Wave;Operating temperature: –55 °C to +105 °C;Low impedance product series;Load life: 2000–5000 h @ +105 °C; ComponentLink1Description: Manufacturer; ComponentLink1URL: http://www.we-online.com; ComponentLink2Description: Datasheet; ComponentLink2URL: http://katalog.we-online.de/pbs/datasheet/860080680023.pdf; Created by: Karrer Zheng; Created Date: 5/13/2015; Capacitance: 820 μF; Application: Applied to high frequency secondary side output filter loop, general switching power supply, DC-DC converter, AC-DC converter, adapter, charger, TV, VCR, DC motor circuit filter, LCD TV digital audio, digital TV, digital camera, digital video camera, satellite receiver and etc.
footprint WCAP-ATLI 16x25x7.5x0.8
pins: 1, 2

## WCAP-ATLI 16x25x7.5x0.8 860080680024
designator C?, comment 1000 μF
WCAP-ATLI Aluminum Electrolytic Capacitors , 1000 μF; + / - 20%; 50 V , 16 x 25; Manufacturer: Wurth Elektronik; partNo: 860080680024; E-mail: libraries@we-online.com; Characteristics: Aluminum Electrolytic Capacitor;Recommended soldering: Wave;Operating temperature: –55 °C to +105 °C;Low impedance product series;Load life: 2000–5000 h @ +105 °C; ComponentLink1Description: Manufacturer; ComponentLink1URL: http://www.we-online.com; ComponentLink2Description: Datasheet; ComponentLink2URL: http://katalog.we-online.de/pbs/datasheet/860080680024.pdf; Created by: Karrer Zheng; Created Date: 5/13/2015; Capacitance: 1000 μF; Application: Applied to high frequency secondary side output filter loop, general switching power supply, DC-DC converter, AC-DC converter, adapter, charger, TV, VCR, DC motor circuit filter, LCD TV digital audio, digital TV, digital camera, digital video camera, satellite receiver and etc.
footprint WCAP-ATLI 16x25x7.5x0.8
pins: 1, 2


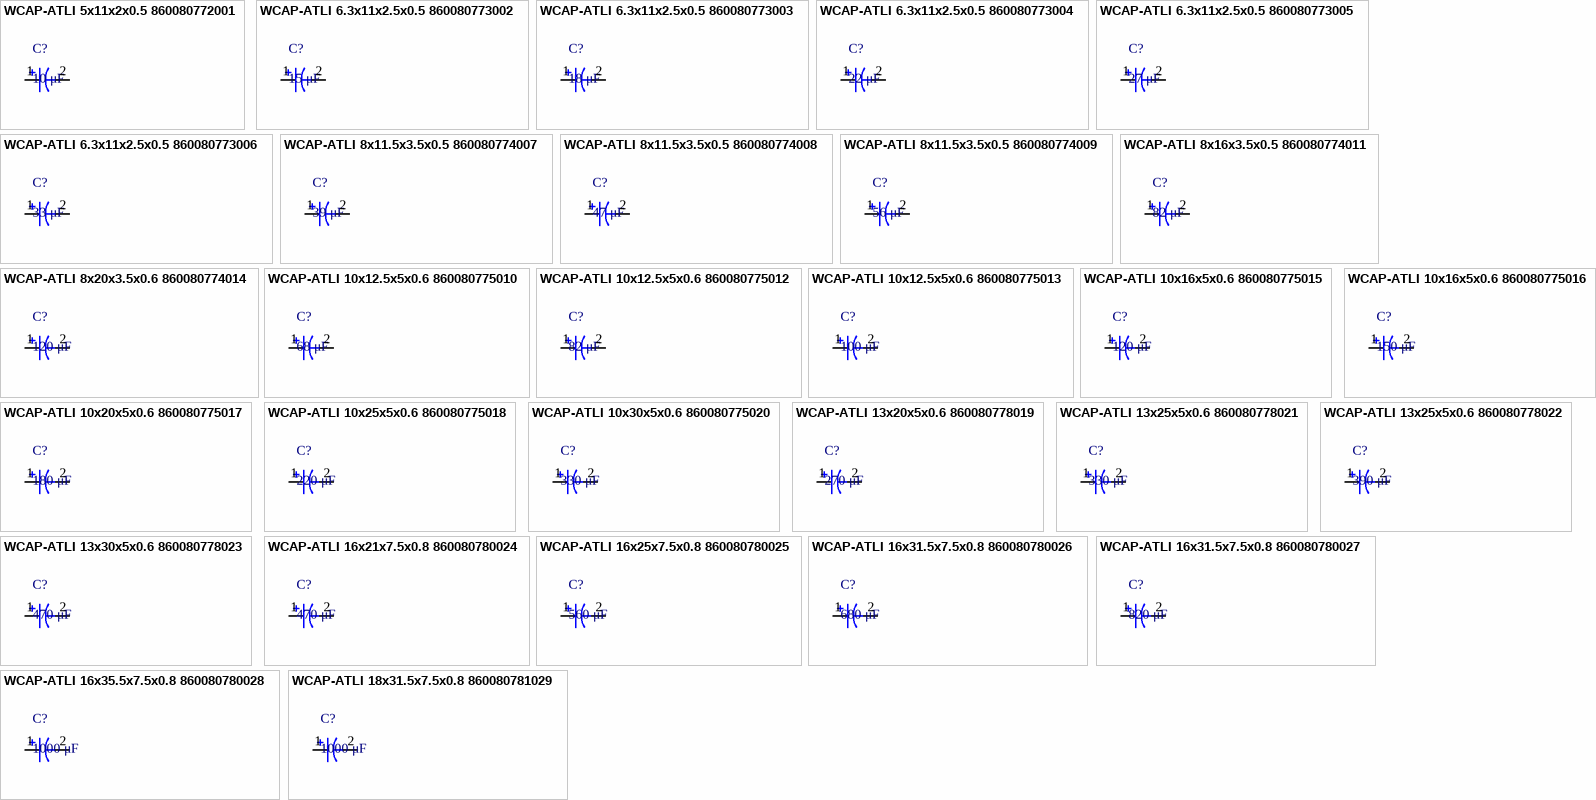
[diagram p4: symbols WCAP-ATLI 5x11x2x0.5 860080772001 to WCAP-ATLI 18x31.5x7.5x0.8 860080781029]